# Altium footprint library B105rlc.PcbLib: 103 footprints (part 4 of 7)
Each footprint in its own frame and in the unit in brackets; x right, y up, seen from the top. Pads: shape width x height; smd on the part's side, far side on the other; paste and mask are expansions set on the pad; w line width, h text height; cw(c..) or ccw(c..) is an arc to the next point about the centre after c.
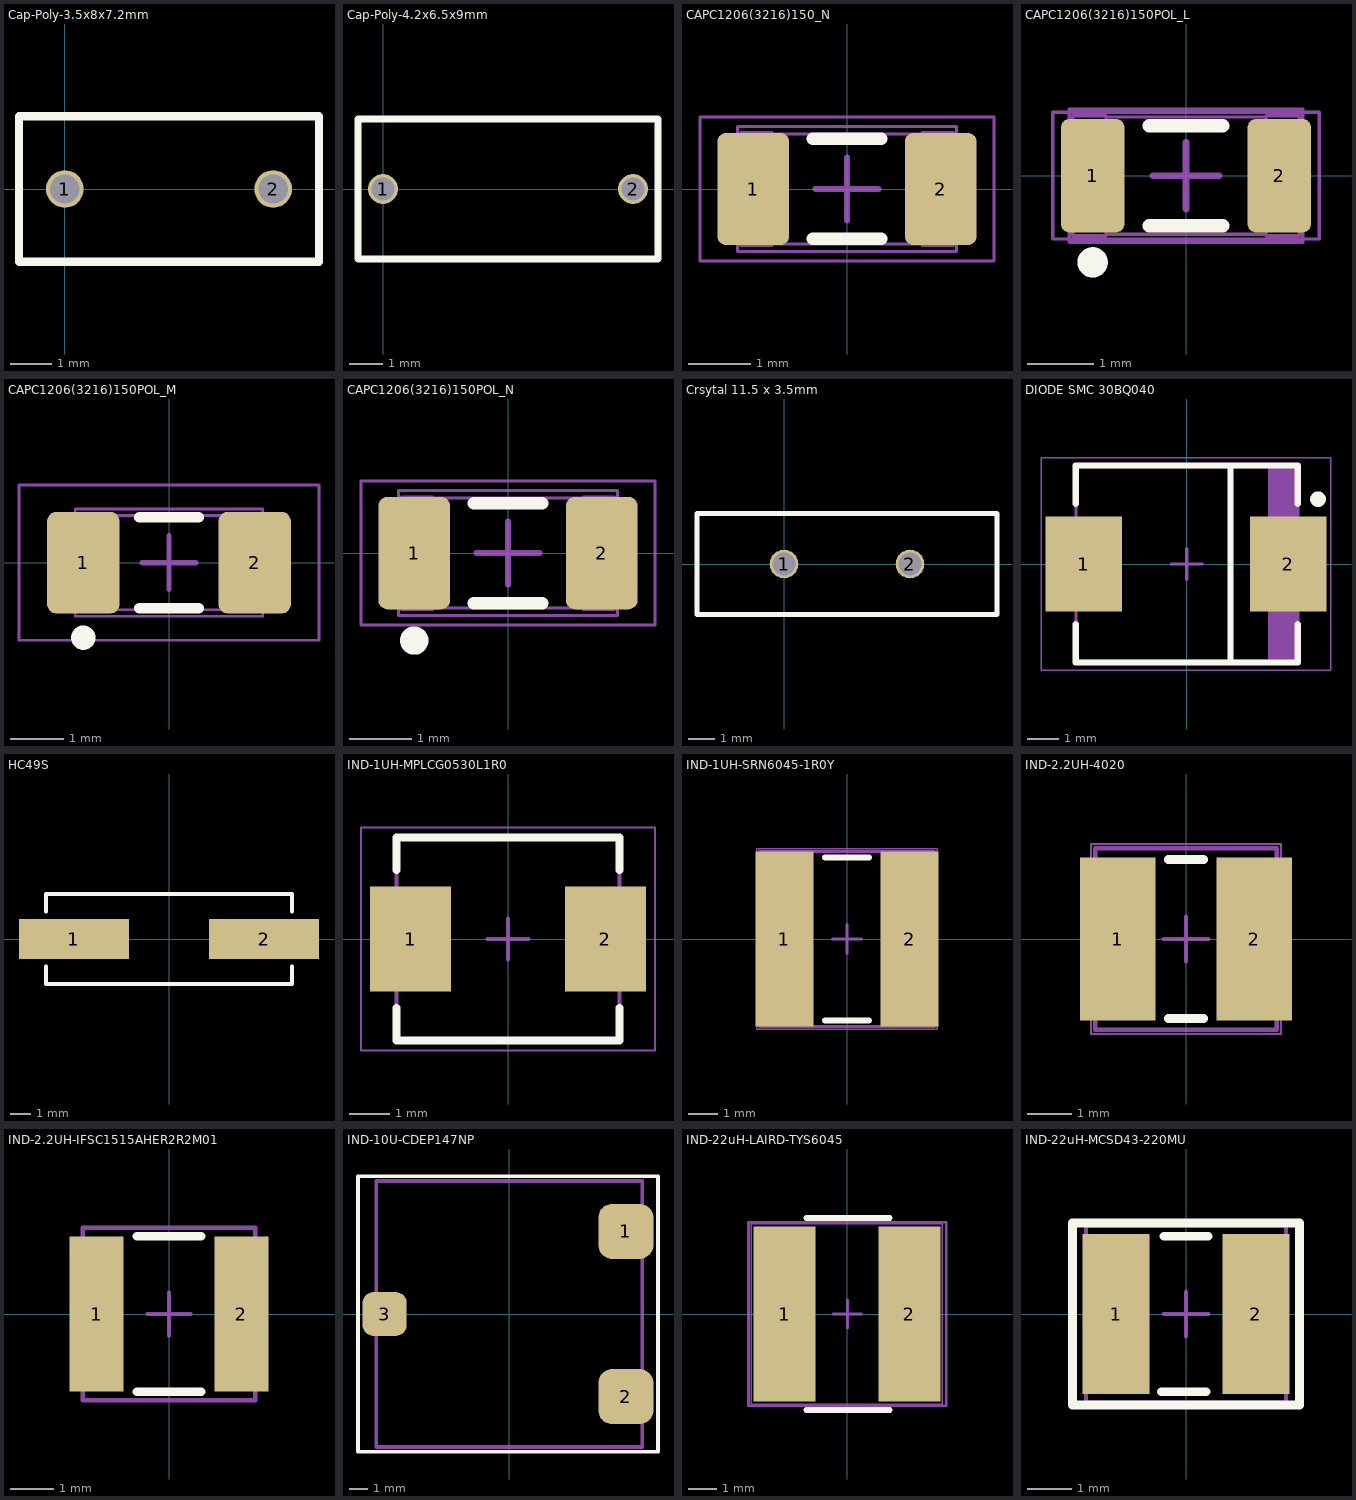
[diagram p3: the footprints below, top view; thin cyan lines are the x and y axes]

## Cap-Poly-3.5x8x7.2mm [mm]
pads (2):
  round 0.9 hole 0.7: 1(0,0) 2(5,0)
Top Overlay:
  lines w0.2: -1.1,-1.75 6.1,-1.75 6.1,1.75 -1.1,1.75 -1.1,-1.75
3D body: height 8, standoff 0, extent -1.1,-1.75 6.1,1.75

## Cap-Poly-4.2x6.5x9mm [mm]
pads (2):
  round 0.9 hole 0.7: 1(0,0) 2(7.5,0)
Top Overlay:
  lines w0.2: -0.75,-2.1 8.25,-2.1 8.25,2.1 -0.75,2.1 -0.75,-2.1
3D body: height 6.5, standoff 0, extent -0.75,-2.1 8.25,2.1

## CAPC1206(3216)150_N [mm]
pads (2):
  rrect25% 1.15x1.8 smd: 1(-1.5,0) 2(1.5,0)
Top Overlay:
  lines w0.2: -0.55,-0.8 0.55,-0.8 ; -0.55,0.8 0.55,0.8
Mechanical 5:
  lines w0.05: -1.75,-1 -1.75,1 1.75,1 1.75,-1 -1.75,-1
  text ".Designator" at 0.9,0.3 h0.6
Mechanical 13:
  lines w0.05: -1.2,-0.88 1.2,-0.88 ; -1.2,0.88 1.2,0.88 ; -1.7,-0.9 -1.2,-0.9 -1.2,0.9 -1.7,0.9 -1.7,-0.9 ; 1.2,-0.9 1.7,-0.9 1.7,0.9 1.2,0.9 1.2,-0.9
Mechanical 15:
  lines w0.05: -2.35,-1.15 2.35,-1.15 2.35,1.15 -2.35,1.15 -2.35,-1.15
  lines w0.1: -0.5,0 0.5,0 ; 0,-0.5 0,0.5
3D body "CAPC3216X180N - 1206 (3216 metric).STEP": height 1.8, standoff 0, extent -1.7,-0.9 1.7,0.9

## CAPC1206(3216)150POL_L [mm] "Chip Capacitor, Body 3.2x1.6mm, Height 1.5mm, IPC High Density"
height 1.5
pads (2):
  rrect25% 0.95x1.7 smd: 1(-1.4,0) 2(1.4,0)
Top Overlay:
  circle w0.254: c-1.4,-1.3 r0.1
  lines w0.2: -0.55,-0.75 0.55,-0.75 ; -0.55,0.75 0.55,0.75
Mechanical 5:
  lines w0.05: -1.75,-1 1.75,-1 1.75,1 -1.75,1 -1.75,-1
  lines w0.2: -1.4,-0.5 -1.4,0.5
  text ".Designator" at -0.825,-0.225 h0.6
Mechanical 13:
  lines w0.05: -1.2,-0.88 1.2,-0.88 ; -1.2,0.88 1.2,0.88 ; -1.7,-0.9 -1.2,-0.9 -1.2,0.9 -1.7,0.9 -1.7,-0.9 ; 1.2,-0.9 1.7,-0.9 1.7,0.9 1.2,0.9 1.2,-0.9
Mechanical 15:
  lines w0.05: -2,-0.95 2,-0.95 2,0.95 -2,0.95 -2,-0.95
  lines w0.1: -0.5,0 0.5,0 ; 0,-0.5 0,0.5
3D body "CAPC3216X180N - 1206 (3216 metric).STEP": height 1.8, standoff 0, extent -1.7,-0.9 1.7,0.9

## CAPC1206(3216)150POL_M [mm] "Chip Capacitor, Body 3.2x1.6mm, Height 1.5mm, IPC Low Density"
height 1.5
pads (2):
  rrect25% 1.35x1.9 smd: 1(-1.6,0) 2(1.6,0)
Top Overlay:
  circle w0.254: c-1.6,-1.4 r0.1
  lines w0.2: -0.55,-0.85 0.55,-0.85 ; -0.55,0.85 0.55,0.85
Mechanical 5:
  lines w0.05: -1.75,-1 1.75,-1 1.75,1 -1.75,1 -1.75,-1
  lines w0.2: -1.4,-0.5 -1.4,0.5
  text ".Designator" at -0.825,-0.225 h0.6
Mechanical 13:
  lines w0.05: -1.2,-0.88 1.2,-0.88 ; -1.2,0.88 1.2,0.88 ; -1.7,-0.9 -1.2,-0.9 -1.2,0.9 -1.7,0.9 -1.7,-0.9 ; 1.2,-0.9 1.7,-0.9 1.7,0.9 1.2,0.9 1.2,-0.9
Mechanical 15:
  lines w0.05: -2.8,-1.45 2.8,-1.45 2.8,1.45 -2.8,1.45 -2.8,-1.45
  lines w0.1: -0.5,0 0.5,0 ; 0,-0.5 0,0.5
3D body "CAPC3216X180N - 1206 (3216 metric).STEP": height 1.8, standoff 0, extent -1.7,-0.9 1.7,0.9

## CAPC1206(3216)150POL_N [mm] "Chip Capacitor, Body 3.2x1.6mm, Height 1.5mm, IPC Medium Density"
height 1.5
pads (2):
  rrect25% 1.15x1.8 smd: 1(-1.5,0) 2(1.5,0)
Top Overlay:
  circle w0.254: c-1.5,-1.4 r0.1
  lines w0.2: -0.55,-0.8 0.55,-0.8 ; -0.55,0.8 0.55,0.8
Mechanical 5:
  lines w0.05: -1.75,-1 -1.75,1 1.75,1 1.75,-1 -1.75,-1
  lines w0.2: -1.4,-0.5 -1.4,0.5
  text ".Designator" at -0.825,-0.225 h0.6
Mechanical 13:
  lines w0.05: -1.2,-0.88 1.2,-0.88 ; -1.2,0.88 1.2,0.88 ; -1.7,-0.9 -1.2,-0.9 -1.2,0.9 -1.7,0.9 -1.7,-0.9 ; 1.2,-0.9 1.7,-0.9 1.7,0.9 1.2,0.9 1.2,-0.9
Mechanical 15:
  lines w0.05: -2.35,-1.15 2.35,-1.15 2.35,1.15 -2.35,1.15 -2.35,-1.15
  lines w0.1: -0.5,0 0.5,0 ; 0,-0.5 0,0.5
3D body "CAPC3216X180N - 1206 (3216 metric).STEP": height 1.8, standoff 0, extent -1.7,-0.9 1.7,0.9

## Crsytal 11.5 x 3.5mm [mm]
pads (2):
  round 1.1 hole 0.9: 1(0,0) 2(4.85,0)
Top Overlay:
  lines w0.2: -3.35,-1.95 8.2,-1.95 8.2,1.95 -3.35,1.95 -3.35,-1.95
3D body "HC-49_LT_THT.step": height 3.6, standoff -1.99, extent -3.225,-2.35 8.125,2.3

## DIODE SMC 30BQ040 [mm] "Molded Diode, 2-Leads, Body 6,85x5,90mm, IPC Medium Density"
height 2.62
pads (2):
  rect 2.45x3.05 smd: 1(-3.3,0) 2(3.25,0)
Top Overlay:
  circle w0.25: c4.2,2.075 r0.125
  lines w0.2: -3.55,-1.925 -3.55,-3.15 3.55,-3.15 3.55,-1.925 ; -3.55,1.925 -3.55,3.15 3.55,3.15 3.55,1.925 ; 1.4,-3.1 1.4,3.15
Mechanical 13:
  rectangle: 2.595,-3.1 3.55,3.1
  lines w0.1: -3.55,-3.1 -3.55,3.1 3.55,3.1 3.55,-3.1 -3.55,-3.1
Mechanical 15:
  lines w0.05: -4.65,-3.4 -4.65,3.4 4.6,3.4 4.6,-3.4 -4.65,-3.4
  lines w0.1: -0.5,0 0.5,0 ; 0,-0.5 0,0.5
3D body "Diode SMC.step": height 2.4, standoff -0.05, extent -3.9,-2.95 3.9,2.95

## HC49S [mm]
height 3.8
pads (2):
  rect 5.5x2 smd: 1(-4.75,0) 2(4.75,0)
Top Overlay:
  lines w0.2: -6.15,-1.375 -6.15,-2.25 6.15,-2.25 6.15,-1.375 ; -6.15,1.375 -6.15,2.25 6.15,2.25 6.15,1.375
3D body "HC49SMD C.STEP": height 3.6, standoff 0, extent -6.15,-2.25 6.15,2.25

## IND-1UH-MPLCG0530L1R0 [mm]
height 3
pads (2):
  rect 2x2.6 smd: 1(-2.4,0) 2(2.4,0)
Top Overlay:
  lines w0.2: -2.75,-1.7 -2.75,-2.5 2.75,-2.5 2.75,-1.7 ; -2.75,1.7 -2.75,2.5 2.75,2.5 2.75,1.7
Mechanical 13:
  lines w0.1: -2.75,-2.5 2.75,-2.5 2.75,2.5 -2.75,2.5 -2.75,-2.5
Mechanical 15:
  lines w0.05: -3.625,-2.75 3.625,-2.75 3.625,2.75 -3.625,2.75 -3.625,-2.75
  lines w0.1: -0.5,0 0.5,0 ; 0,-0.5 0,0.5
3D body "Inductor-LPS5030.step": height 3, standoff 0, extent -2.505,-2.505 2.505,2.505

## IND-1UH-SRN6045-1R0Y [mm] "Inductor, 2-Leads, Body 6,00x6,00mm, IPC Medium Density"
height 4.5
pads (2):
  rect 2x6 smd: 1(-2.15,0) 2(2.15,0)
Top Overlay:
  lines w0.2: -0.75,-2.8 0.75,-2.8 ; -0.75,2.8 0.75,2.8
Mechanical 13:
  lines w0.1: -3,-3 3,-3 3,3 -3,3 -3,-3
Mechanical 15:
  lines w0.05: -3.1,-3.1 3.1,-3.1 3.1,3.1 -3.1,3.1 -3.1,-3.1
  lines w0.1: -0.5,0 0.5,0 ; 0,-0.5 0,0.5
3D body "srn6045.stp": height 4.5, standoff 0, extent -3,-3 3,3

## IND-2.2UH-4020 [mm] "Inductor, 2-Leads, Body 4,00x4,00mm, IPC Medium Density"
height 2.1
pads (2):
  rect 1.7x3.7 smd: 1(-1.545,0) 2(1.545,0)
Top Overlay:
  lines w0.2: -0.4,-1.8 0.4,-1.8 ; -0.4,1.8 0.4,1.8
Mechanical 13:
  lines w0.1: -2.05,-2.05 2.05,-2.05 2.05,2.05 -2.05,2.05 -2.05,-2.05
Mechanical 15:
  lines w0.05: -2.15,-2.15 2.15,-2.15 2.15,2.15 -2.15,2.15 -2.15,-2.15
  lines w0.1: -0.5,0 0.5,0 ; 0,-0.5 0,0.5
3D body "WE-MAPI-4020-rev1.stp": height 2.1, standoff 0, extent -2.05,-2.05 2.05,2.05

## IND-2.2UH-IFSC1515AHER2R2M01 [mm] "Inductor, 2-Leads, Body 4,00x4,00mm, IPC Medium Density"
height 1.8
pads (2):
  rect 1.25x3.6 smd: 1(-1.675,0) 2(1.675,0)
Top Overlay:
  lines w0.2: -0.75,-1.8 0.75,-1.8 ; -0.75,1.8 0.75,1.8
Mechanical 13:
  lines w0.1: -2,-2 2,-2 2,2 -2,2 -2,-2
Mechanical 15:
  lines w0.05: -2,-2 2,-2 2,2 -2,2 -2,-2
  lines w0.1: -0.5,0 0.5,0 ; 0,-0.5 0,0.5
3D body "IFSC-1515AH.STEP": height 1.8, standoff 0, extent -1.975,-1.975 1.975,1.975

## IND-10U-CDEP147NP [mm] "14.5x14.5mm"
pads (3):
  rrect50% 3x3 smd: 1(6.35,4.5) 2(6.35,-4.5)
  rrect50% 2.4x2.4 smd: 3(-6.8,0)
Top Overlay:
  lines w0.2: -8.25,-7.5 8.1,-7.5 8.1,7.5 -8.25,7.5 -8.25,-7.5
Mechanical 13:
  lines w0.2: -7.25,-7.25 -7.25,7.25 7.25,7.25 7.25,-7.25 -7.25,-7.25
3D body "User Library-Sumida 147.step": height 8, standoff 0, extent -7.25,-7.25 7.25,7.25

## IND-22uH-LAIRD-TYS6045 [mm]
height 4.5
pads (2):
  rect 2.2x6.2 smd: 1(-2.225,0) 2(2.195,0)
Top Overlay:
  lines w0.2: -1.45,-3.4 1.5,-3.4 ; -1.45,3.4 1.5,3.4
Mechanical 13:
  lines w0.1: -3.5,-3.25 3.5,-3.25 3.5,3.25 -3.5,3.25 -3.5,-3.25
Mechanical 15:
  lines w0.05: -3.4,-3.2 3.35,-3.2 3.35,3.2 -3.4,3.2 -3.4,-3.2
  lines w0.1: -0.5,0 0.5,0 ; 0,-0.5 0,0.5
3D body "User Library-cdrh5d28.step": height 2.9, standoff -0.1, extent -3,-3 3,3

## IND-22uH-MCSD43-220MU [mm]
height 3.2
pads (2):
  rect 1.5x3.6 smd: 1(-1.575,0) 2(1.575,0)
Top Overlay:
  lines w0.2: -0.55,-1.75 0.45,-1.75 ; -0.5,1.75 0.5,1.75 ; -2.55,-2.05 2.55,-2.05 2.55,2.05 -2.55,2.05 -2.55,-2.05
Mechanical 13:
  lines w0.1: -2.25,-2 2.25,-2 2.25,2 -2.25,2 -2.25,-2
Mechanical 15:
  lines w0.05: -2.55,-2.05 2.55,-2.05 2.55,2.05 -2.55,2.05 -2.55,-2.05
  lines w0.1: -0.5,0 0.5,0 ; 0,-0.5 0,0.5
3D body "Coilcraft-XAL4020.step": height 2, standoff -0.1, extent -2.15,-2.15 2.15,2.15